# Altium footprint library M_Derogarian Altium Library.PcbLib: 137 footprints (part 6 of 9)
Each footprint in its own frame and in the unit in brackets; x right, y up, seen from the top. Pads: shape width x height; smd on the part's side, far side on the other; paste and mask are expansions set on the pad; w line width, h text height; cw(c..) or ccw(c..) is an arc to the next point about the centre after c.
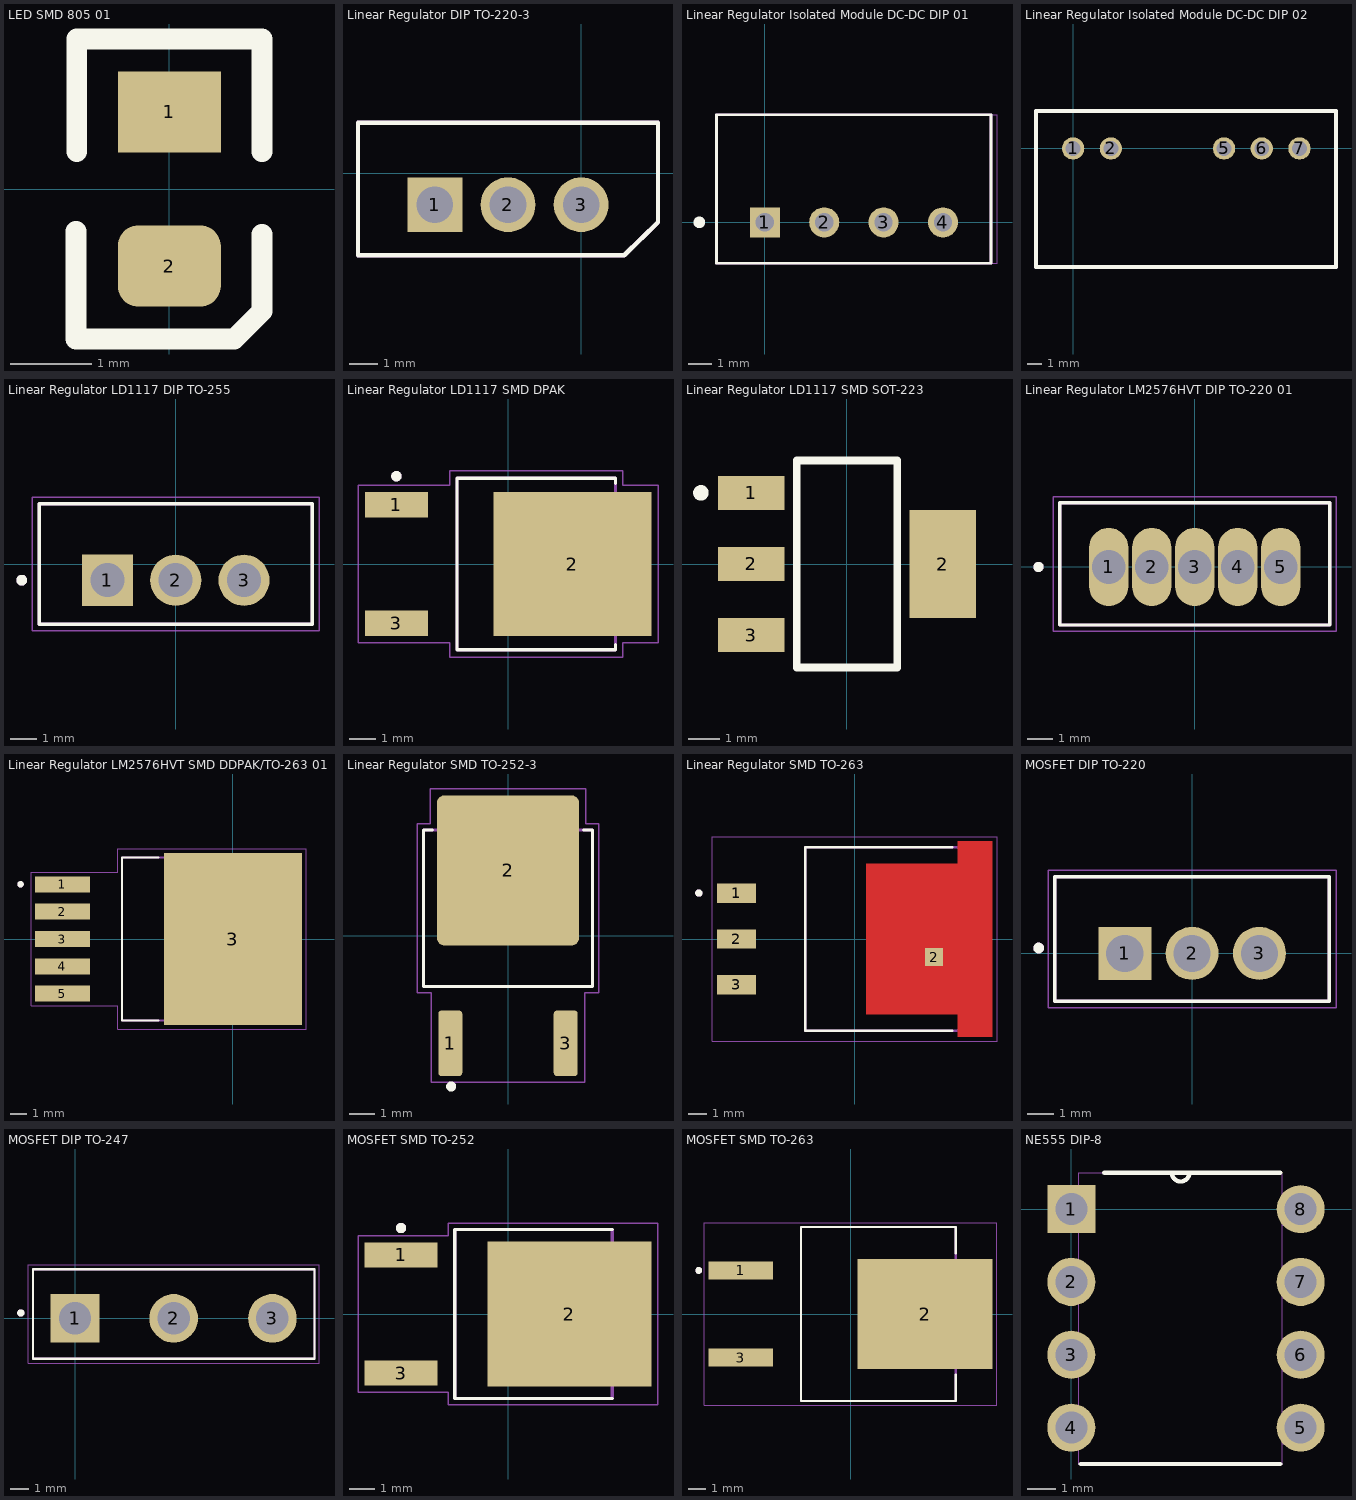
[diagram p5: the footprints below, top view; thin cyan lines are the x and y axes]

## LED SMD 805 01 [mm]
pads (2):
  rect 1.27x1 smd: 1(0,0.95)
  rrect50% 1.27x1 smd: 2(0,-0.95)
Top Overlay:
  lines w0.254: -1.15,-0.522 -1.15,-1.85 0.8,-1.85 1.143,-1.507 1.143,-0.558 ; -1.143,0.458 -1.143,1.85 1.143,1.85 1.143,0.458
3D body "everlight-17-21-0805LED-GREEN.STEP": height 0.8, standoff -0.31, extent -0.625,-1.05 0.625,0.95

## Linear Regulator DIP TO-220-3 [mil]
pads (3):
  rect 75x75 hole 50: 1(-200,-43)
  round 75 hole 50: 2(-100,-43) 3(0,-43)
Top Overlay:
  lines w6: -305,-112 -305,69 105,69 105,-67 59,-112 -305,-112
Mechanical 13:
  lines w6: -305,-112 -305,69 105,69 105,-67 59,-112 -305,-112
3D body "L7812ACV.STEP": height 774.8, standoff -362.99, extent -300.79,-108.17 100.79,69

## Linear Regulator Isolated Module DC-DC DIP 01 [mm]
pads (4):
  rect 1.288x1.288 hole 0.78: 1(0,0)
  round 1.288 hole 0.78: 2(2.54,0) 3(5.08,0) 4(7.62,0)
Top Overlay:
  circle w0.3: c-2.8,0 r0.1
  lines w0.127: -2.06,-1.75 -2.06,4.6 9.68,4.6 9.68,-1.75 -2.06,-1.75
Mechanical 13:
  lines w0.127: -2.06,-1.75 9.68,-1.75 9.68,4.6 -2.06,4.6 -2.06,-1.75
Mechanical 15:
  lines w0.05: -2.05,-1.75 9.93,-1.75 9.93,4.6 -2.05,4.6 -2.05,-1.75
3D body "User Library-SIL-K4.STEP": height 9.66, standoff -3, extent -1.95,-1.61 9.75,4.5

## Linear Regulator Isolated Module DC-DC DIP 02 [mm]
pads (5):
  round 1.5 hole 1: 1(0,0) 2(2.54,0) 5(10.16,0) 6(12.7,0) 7(15.24,0)
Top Overlay:
  lines w0.254: -2.5,-7.98 17.7,-7.98 17.7,2.52 -2.5,2.52 -2.5,-7.98
Mechanical 29:
  lines w0.254: -2.5,-7.98 -2.5,2.52 17.7,2.52 17.7,-7.98 -2.5,-7.98
  text "'.Designator'" at -1,-5.18 h1.52
3D body "MGJ2_MUR.step": height 12.75, standoff -6.1, extent -2.3,-7.458 17.462,2.6

## Linear Regulator LD1117 DIP TO-255 [mm]
height 19.68
pads (3):
  rect 1.91x1.91 / inner round 1.91 / far side rect 1.91x1.91 hole 1.27: 1(-2.55,-0.605)
  round 1.91 hole 1.27: 2(0,-0.605) 3(2.55,-0.605)
Top Overlay:
  circle w0.2: c-5.75,-0.605 r0.1
  lines w0.127: -5.1,-2.25 5.1,-2.25 5.1,2.25 -5.1,2.25 -5.1,-2.25
Mechanical 13:
  circle w0.2: c-5.75,-0.605 r0.1
  lines w0.127: -5.1,-2.25 -5.1,2.25 5.1,2.25 5.1,-2.25 -5.1,-2.25
Mechanical 15:
  lines w0.05: -5.35,-2.5 -5.35,2.5 5.35,2.5 5.35,-2.5 -5.35,-2.5
3D body "step_temp.STEP": height 19.68, standoff -10.34, extent -4.985,-2.195 4.985,2.25

## Linear Regulator LD1117 SMD DPAK [mm]
pads (3):
  rect 2.44x0.97 smd: 1(-4.29,2.28) 3(-4.29,-2.28)
  rect 6.07x5.55 smd paste-4: 2(2.48,0)
Top Overlay:
  circle w0.2: c-4.293,3.378 r0.1
  lines w0.127: 4.135,-3.095 4.135,-3.3 -1.965,-3.3 -1.965,3.3 4.135,3.3 4.135,3.095
Top Paste:
  region: 1.24,0.425 -0.22,0.425 -0.22,2.355 1.24,2.355
  region: 1.24,-2.355 -0.22,-2.355 -0.22,-0.425 1.24,-0.425
  region: 3.27,0.425 1.81,0.425 1.81,2.355 3.27,2.355
  region: 3.27,-2.355 1.81,-2.355 1.81,-0.425 3.27,-0.425
  region: 5.3,0.425 3.84,0.425 3.84,2.355 5.3,2.355
  region: 5.3,-2.355 3.84,-2.355 3.84,-0.425 5.3,-0.425
Mechanical 13:
  circle w0.2: c-4.293,3.378 r0.1
  lines w0.127: -1.965,-3.3 -1.965,3.3 4.135,3.3 4.135,-3.3 -1.965,-3.3
Mechanical 15:
  lines w0.05: -5.77,-3.02 -5.77,3.02 -2.24,3.02 -2.24,3.58 4.41,3.58 4.41,3.03 5.77,3.03 5.77,-3.03 4.41,-3.03 4.41,-3.58 -2.24,-3.58 -2.24,-3.02 -5.77,-3.02
3D body "User Library-TO252AA.STEP": height 2.3, standoff -0.01, extent -5.307,-3.278 4.393,3.302

## Linear Regulator LD1117 SMD SOT-223 [mm]
pads (4):
  rect 2.15x1.1 smd: 1(-3.1,2.3) 2(-3.1,0) 3(-3.1,-2.3)
  rect 2.15x3.5 smd: 2(3.1,0)
Top Overlay:
  circle w0.25: c-4.725,2.3 r0.125
  lines w0.254: -1.625,-3.35 -1.625,3.35 1.625,3.35 1.625,-3.35 -1.625,-3.35
3D body "CircuitWorks-SOT-223.STEP": height 1.7, standoff 0.02, extent -3.58,-3.35 3.38,3.15

## Linear Regulator LM2576HVT DIP TO-220 01 [mm]
pads (5):
  oval 1.55x3.1 hole 1.34: 1(-3.4,0) 2(-1.7,0) 3(0,0) 4(1.7,0) 5(3.4,0)
Top Overlay:
  circle w0.2: c-6.175,0 r0.1
  lines w0.127: -5.335,-2.29 -5.335,2.54 5.335,2.54 5.335,-2.29 -5.335,-2.29
Mechanical 13:
  circle w0.2: c-6.175,0 r0.1
  lines w0.127: -5.335,-2.29 -5.335,2.54 5.335,2.54 5.335,-2.29 -5.335,-2.29
Mechanical 15:
  lines w0.05: -5.585,-2.54 -5.585,2.775 5.585,2.775 5.585,-2.54 -5.585,-2.54
3D body "step_temp.STEP": height 16.84, standoff -14.73, extent -4.851,-1.702 5.309,2.743

## Linear Regulator LM2576HVT SMD DDPAK/TO-263 01 [mm]
pads (6):
  rect 3.4x1 smd paste-0.05 mask+0.07: 1(-10.6,3.4) 2(-10.6,1.7) 3(-10.6,0) 4(-10.6,-1.7) 5(-10.6,-3.4)
  rect 8.6x10.7 smd paste-0.05 mask+0.07: 3(0,0)
Top Overlay:
  circle w0.2: c-13.2,3.4 r0.1
  lines w0.127: -4.62,-5.08 -6.905,-5.08 -6.905,5.08 -4.62,5.08
Mechanical 13:
  circle w0.2: c-13.2,3.4 r0.1
  lines w0.127: -6.905,-5.08 -6.905,5.08 2.02,5.08 2.02,-5.08 -6.905,-5.08
Mechanical 15:
  lines w0.05: -12.55,-4.15 -7.155,-4.15 -7.155,-5.6 4.55,-5.6 4.55,5.6 -7.155,5.6 -7.155,4.15 -12.55,4.15 -12.55,-4.15
3D body "LM2576S-12.STEP": height 4.65, standoff -0.15, extent -11.367,-5.105 2.984,5.055

## Linear Regulator SMD TO-252-3 [mm]
pads (3):
  rrect25% 0.95x2.59 smd: 1(-2.286,-4.26) 3(2.286,-4.26)
  rrect10% 5.63x5.94 smd: 2(0,2.59)
Top Overlay:
  circle w0.2: c-2.25,-5.969 r0.1
  lines w0.127: -3,4.19 -3.35,4.19 -3.35,-2.01 3.35,-2.01 3.35,4.19 3,4.19
Mechanical 13:
  lines w0.127: -3.35,-2.01 3.35,-2.01 3.35,4.19 -3.35,4.19 -3.35,-2.01
Mechanical 15:
  lines w0.05: -3.6,-2.26 -3.6,4.44 -3.07,4.44 -3.07,5.81 3.07,5.81 3.07,4.44 3.6,4.44 3.6,-2.26 3.03,-2.26 3.03,-5.81 -3.03,-5.81 -3.03,-2.26 -3.6,-2.26
3D body "User Library-TO-252-3.STEP": height 2.41, standoff 0, extent -3.409,-5.006 3.291,5.346

## Linear Regulator SMD TO-263 [mm]
pads (4):
  rect 2.16x1.07 smd: 1(-6.545,2.54) 2(-6.545,0) 3(-6.545,-2.54)
  rect 1x1 smd paste-1 mask+0: 2(4.4,-1)
Top Layer:
  region: 7.625,-5.4 5.715,-5.4 5.715,-4.165 0.635,-4.165 0.635,4.165 5.715,4.165 5.715,5.4 7.625,5.4
Top Overlay:
  circle w0.2: c-8.625,2.54 r0.1
  lines w0.127: 5.395,-5.08 -2.735,-5.08 -2.735,5.08 5.395,5.08
Top Paste:
  region: 2.605,0.285 1.205,0.285 1.205,1.795 2.605,1.795
  region: 5.145,0.285 3.745,0.285 3.745,1.795 5.145,1.795
  region: 2.605,-1.795 1.205,-1.795 1.205,-0.285 2.605,-0.285
  region: 5.145,-1.795 3.745,-1.795 3.745,-0.285 5.145,-0.285
  region: 2.605,2.365 1.205,2.365 1.205,3.875 2.605,3.875
  region: 5.145,2.365 3.745,2.365 3.745,3.875 5.145,3.875
  region: 2.605,-3.875 1.205,-3.875 1.205,-2.365 2.605,-2.365
  region: 5.145,-3.875 3.745,-3.875 3.745,-2.365 5.145,-2.365
  region: 7.095,0.065 6.245,0.065 6.245,1.285 7.095,1.285
  region: 7.095,-1.285 6.245,-1.285 6.245,-0.065 7.095,-0.065
  region: 7.095,1.415 6.245,1.415 6.245,2.635 7.095,2.635
  region: 7.095,2.765 6.245,2.765 6.245,3.985 7.095,3.985
  region: 7.095,4.115 6.245,4.115 6.245,5.335 7.095,5.335
  region: 7.095,-3.985 6.245,-3.985 6.245,-2.765 7.095,-2.765
  region: 7.095,-5.335 6.245,-5.335 6.245,-4.115 7.095,-4.115
  region: 7.095,-2.635 6.245,-2.635 6.245,-1.415 7.095,-1.415
Top Solder:
  region: 7.728,-5.5 5.618,-5.5 5.618,-4.265 0.538,-4.265 0.538,4.265 5.618,4.265 5.618,5.5 7.728,5.5
Mechanical 13:
  circle w0.2: c-8.625,2.54 r0.1
  lines w0.127: -2.735,-5.08 5.905,-5.08 5.905,5.08 -2.735,5.08 -2.735,-5.08
Mechanical 15:
  lines w0.05: -7.875,-5.65 -7.875,5.65 7.875,5.65 7.875,-5.65 -7.875,-5.65
3D body "step_temp.STEP": height 4.65, standoff -0.15, extent -7.175,-5.08 7.175,5.08

## MOSFET DIP TO-220 [mm]
pads (3):
  rect 2x2 hole 1.4: 1(-2.54,0)
  round 2 hole 1.4: 2(0,0) 3(2.54,0)
Top Overlay:
  circle w0.2: c-5.79,0.2 r0.1
  lines w0.127: -5.18,-1.81 -5.18,2.89 5.18,2.89 5.18,-1.81 -5.18,-1.81
Mechanical 13:
  circle w0.2: c-5.79,0.2 r0.1
  lines w0.127: -5.18,-1.81 -5.18,2.89 5.18,2.89 5.18,-1.81 -5.18,-1.81
Mechanical 15:
  lines w0.05: -5.43,-2.06 -5.43,3.14 5.43,3.14 5.43,-2.06 -5.43,-2.06
3D body "step_temp.STEP": height 19.65, standoff -9.22, extent -5.156,-1.629 5.004,2.921

## MOSFET DIP TO-247 [mm]
pads (3):
  rect 2.69x2.69 hole 1.79: 1(0,0)
  round 2.69 hole 1.79: 2(5.46,0) 3(10.92,0)
Top Overlay:
  circle w0.2: c-3,0.3 r0.1
  lines w0.127: -2.33,-2.235 -2.33,2.71 13.25,2.71 13.25,-2.235 -2.33,-2.235
Mechanical 13:
  circle w0.2: c-3,0.3 r0.1
  lines w0.127: -2.33,-2.235 -2.33,2.71 13.25,2.71 13.25,-2.235 -2.33,-2.235
Mechanical 15:
  lines w0.05: -2.58,-2.485 -2.58,2.965 13.5,2.965 13.5,-2.485 -2.58,-2.485
3D body "step_temp.STEP": height 30.1, standoff -5, extent -2.339,-2.587 13.261,2.413

## MOSFET SMD TO-252 [mm]
pads (3):
  rect 2.83x0.97 smd: 1(-4.14,2.29) 3(-4.14,-2.29)
  rect 6.35x5.63 smd paste-4: 2(2.38,0)
Top Overlay:
  circle w0.2: c-4.14,3.325 r0.1
  lines w0.127: 4.03,-3.27 -2.065,-3.27 -2.065,3.27 4.03,3.27
Top Paste:
  region: 5.195,-2.27 3.805,-2.27 3.805,-0.55 5.195,-0.55
  region: 0.955,-2.27 -0.435,-2.27 -0.435,-0.55 0.955,-0.55
  region: 3.075,-2.27 1.685,-2.27 1.685,-0.55 3.075,-0.55
  region: 0.955,0.55 -0.435,0.55 -0.435,2.27 0.955,2.27
  region: 3.075,0.55 1.685,0.55 1.685,2.27 3.075,2.27
  region: 5.195,0.55 3.805,0.55 3.805,2.27 5.195,2.27
Mechanical 13:
  circle w0.2: c-4.14,3.325 r0.1
  lines w0.127: -2.065,-3.27 -2.065,3.27 4.03,3.27 4.03,-3.27 -2.065,-3.27
Mechanical 15:
  lines w0.05: -5.805,-3.025 -5.805,3.025 -2.315,3.025 -2.315,3.52 5.805,3.52 5.805,-3.52 -2.315,-3.52 -2.315,-3.025 -5.805,-3.025
3D body "FDD6690A.STEP": height 2.52, standoff 0, extent -5.41,-3.27 4.495,3.27

## MOSFET SMD TO-263 [mm]
pads (3):
  rect 3.78x1.06 smd: 1(-6.4,2.54) 3(-6.4,-2.54)
  rect 7.88x6.39 smd paste-5: 2(4.35,0)
Top Overlay:
  circle w0.2: c-8.85,2.54 r0.1
  lines w0.127: 6.133,-3.52 6.133,-5.08 -2.888,-5.08 -2.888,5.08 6.133,5.08 6.133,3.52
Top Paste:
  region: 2.12,-0.72 0.67,-0.72 0.67,0.72 2.12,0.72
  region: 4.09,-0.72 2.64,-0.72 2.64,0.72 4.09,0.72
  region: 6.06,-0.72 4.61,-0.72 4.61,0.72 6.06,0.72
  region: 8.03,-0.72 6.58,-0.72 6.58,0.72 8.03,0.72
  region: 2.12,1.41 0.67,1.41 0.67,2.85 2.12,2.85
  region: 4.09,1.41 2.64,1.41 2.64,2.85 4.09,2.85
  region: 6.06,1.41 4.61,1.41 4.61,2.85 6.06,2.85
  region: 8.03,1.41 6.58,1.41 6.58,2.85 8.03,2.85
  region: 2.12,-2.85 0.67,-2.85 0.67,-1.41 2.12,-1.41
  region: 4.09,-2.85 2.64,-2.85 2.64,-1.41 4.09,-1.41
  region: 6.06,-2.85 4.61,-2.85 4.61,-1.41 6.06,-1.41
  region: 8.03,-2.85 6.58,-2.85 6.58,-1.41 8.03,-1.41
Mechanical 13:
  circle w0.2: c-8.85,2.54 r0.1
  lines w0.127: -2.888,-5.08 6.133,-5.08 6.133,5.08 -2.888,5.08 -2.888,-5.08
Mechanical 15:
  lines w0.05: -8.54,-5.33 8.54,-5.33 8.54,5.33 -8.54,5.33 -8.54,-5.33
3D body "step_temp.STEP": height 4.83, standoff -0.25, extent -7.874,-5.08 7.366,5.08

## NE555 DIP-8 [mil]
pads (8):
  rect 66x66 / inner round 66 / far side rect 66x66 hole 44: 1(0,0)
  round 66 hole 44: 2(0,-100) 3(0,-200) 4(0,-300) 5(314.96,-300) 6(314.96,-200) 7(314.96,-100) 8(314.96,0)
Top Overlay:
  lines w6: 13,-350 287,-350 ; 45,50 138,50 ; 287,50 162,50 ; 138,50 ccw(c150,50) 162,50 ; 138,50 162,50
Mechanical 13:
  lines w0: 138,50 ccw(c150,50) 162,50 ; 138,50 10,50 10,-350 290,-350 290,50 162,50 ; 138,50 162,50 ; -22,-322 10,-322 10,-278 -22,-278 -22,-322 ; -22,-222 10,-222 10,-178 -22,-178 -22,-222 ; -22,-122 10,-122 10,-78 -22,-78 -22,-122 ; -22,-22 10,-22 10,22 -22,22 -22,-22 ; 290,-322 322,-322 322,-278 290,-278 290,-322 ; 290,-222 322,-222 322,-178 290,-178 290,-222 ; 290,-122 322,-122 322,-78 290,-78 290,-122 ; 290,-22 322,-22 322,22 290,22 290,-22
3D body "NE555P.STEP": height 200, standoff -125.2, extent 0.2,-334.45 322.64,43.11